# Altium footprint library OT Library.PcbLib: 396 footprints (part 22 of 25)
Each footprint in its own frame and in the unit in brackets; x right, y up, seen from the top. Pads: shape width x height; smd on the part's side, far side on the other; paste and mask are expansions set on the pad; w line width, h text height; cw(c..) or ccw(c..) is an arc to the next point about the centre after c.
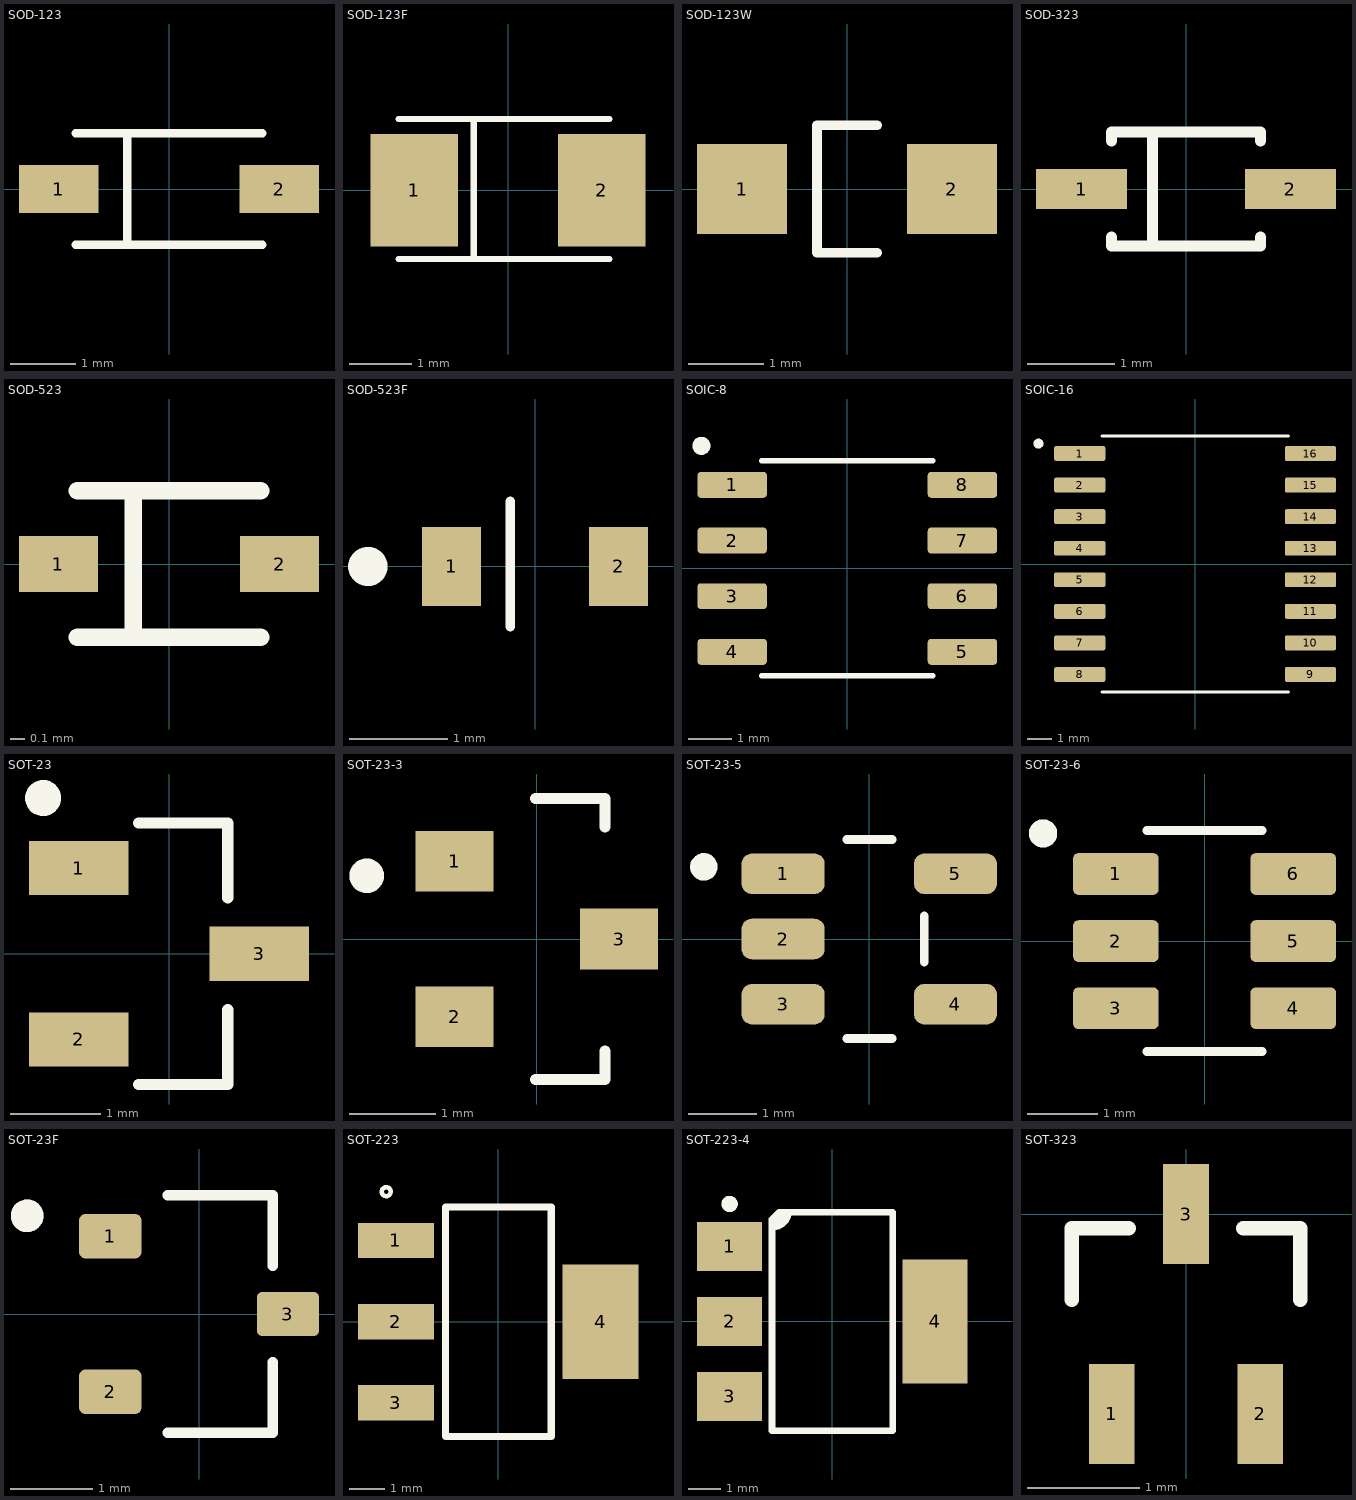
[diagram p21: the footprints below, top view; thin cyan lines are the x and y axes]

## SOD-123 [mm]
pads (2):
  rect 1.21x0.73 smd: 1(-1.68,0) 2(1.68,0)
Top Overlay:
  lines w0.127: -1.425,-0.85 1.425,-0.85 ; -1.425,0.85 1.425,0.85 ; -0.635,-0.85 -0.635,0.838
3D body: height 1.5, standoff -0.03, extent -1.825,-0.775 1.825,0.775

## SOD-123F [mm]
pads (2):
  rect 1.4x1.8 smd: 1(-1.5,0) 2(1.5,0)
Top Overlay:
  lines w0.1: -1.75,-1.1 1.62,-1.1 ; -1.75,1.14 1.62,1.14 ; -0.55,-1.1 -0.55,1.14
3D body: height 1.02, standoff 0, extent -1.9,-0.9 1.9,0.9

## SOD-123W [mm]
pads (2):
  rect 1.2x1.2 smd paste-0.05: 1(-1.4,0) 2(1.4,0)
Top Overlay:
  lines w0.127: 0.4,-0.85 -0.4,-0.85 -0.4,0.85 0.4,0.85
3D body: height 1.1, standoff 0, extent -1.75,-0.85 1.75,0.85

## SOD-323 [mm] "SC-76, SOD-323"
height 1.2
pads (2):
  rect 1.04x0.46 smd: 1(-1.19,0) 2(1.19,0)
Top Overlay:
  lines w0.127: -0.85,-0.55 -0.85,-0.65 0.85,-0.65 0.85,-0.55 ; -0.85,0.55 -0.85,0.65 0.85,0.65 0.85,0.55 ; -0.381,-0.635 -0.381,0.635
3D body: height 1.2, standoff 0, extent -1.25,-0.65 1.25,0.65

## SOD-523 [mm] "SC-79, SOD-523"
pads (2):
  rect 0.56x0.4 smd: 1(-0.785,0) 2(0.785,0)
Top Overlay:
  lines w0.127: -0.65,-0.52 0.65,-0.52 ; -0.65,0.52 0.65,0.52 ; -0.254,-0.52 -0.254,0.52
3D body: height 0.65, standoff 0, extent -0.8,-0.4 0.8,0.4

## SOD-523F [mm]
pads (2):
  rect 0.6x0.8 smd: 1(-0.85,0) 2(0.85,0)
Top Overlay:
  circle w0.2: c-1.703,0 r0.1
  lines w0.1: -0.254,-0.61 -0.254,0.66
3D body: height 0.7, standoff 0, extent -0.8,-0.4 0.8,0.4

## SOIC-8 [mm] "0.154\", 3.90mm Width"
pads (8):
  rrect25% 1.58x0.59 smd: 1(-2.625,1.905) 2(-2.625,0.635) 3(-2.625,-0.635) 4(-2.625,-1.905) 5(2.625,-1.905) 6(2.625,-0.635) 7(2.625,0.635) 8(2.625,1.905)
Top Overlay:
  circle w0.21: c-3.327,2.794 r0.1
  lines w0.127: -1.95,-2.45 1.95,-2.45 ; -1.95,2.45 1.95,2.45
3D body: height 1.75, standoff 0, extent -3,-2.5 3,2.5

## SOIC-16 [mm] "(0.295\", 7.50mm Width)"
pads (16):
  rrect25% 2.06x0.6 smd: 1(-4.64,4.445) 2(-4.64,3.175) 3(-4.64,1.905) 4(-4.64,0.635) 5(-4.64,-0.635) 6(-4.64,-1.905) 7(-4.64,-3.175) 8(-4.64,-4.445) 9(4.64,-4.445) 10(4.64,-3.175) 11(4.64,-1.905) 12(4.64,-0.635) 13(4.64,0.635) 14(4.64,1.905) 15(4.64,3.175) 16(4.64,4.445)
Top Overlay:
  circle w0.2: c-6.3,4.845 r0.1
  lines w0.127: -3.75,-5.15 3.75,-5.15 ; -3.75,5.15 3.75,5.15
3D body: height 2.65, standoff 0, extent -5.15,-5.15 5.15,5.15

## SOT-23 [mm] "TO-236AB"
height 1.1
pads (3):
  rect 1.1x0.6 smd paste-0.05: 1(-1,0.95) 2(-1,-0.95) 3(1,0)
Top Overlay:
  circle w0.2: c-1.397,1.727 r0.1
  lines w0.127: -0.336,-1.45 0.65,-1.45 0.65,-0.62 ; -0.336,1.45 0.65,1.45 0.65,0.62
3D body: height 1.1, standoff 0, extent -1.15,-1.45 1.15,1.45

## SOT-23-3 [mm] "TO-236-3, SC-59, SOT-23-3"
height 1.1
pads (3):
  rect 0.9x0.7 smd: 1(-0.95,0.9) 2(-0.95,-0.9) 3(0.95,0)
Top Overlay:
  circle w0.2: c-1.966,0.73 r0.1
  lines w0.127: -0.018,-1.625 0.787,-1.625 0.787,-1.295 ; -0.018,1.625 0.787,1.625 0.787,1.295
3D body: height 1.12, standoff 0, extent -1.321,-1.524 1.321,1.524

## SOT-23-5 [mm] "SC-74A, SOT-753"
pads (5):
  rrect50% 1.21x0.59 smd: 1(-1.255,0.95) 2(-1.255,0) 3(-1.255,-0.95) 4(1.255,-0.95) 5(1.255,0.95)
Top Overlay:
  circle w0.2: c-2.41,1.05 r0.1
  lines w0.127: -0.33,-1.45 0.33,-1.45 ; -0.33,1.45 0.33,1.45 ; 0.8,-0.335 0.8,0.335
3D body: height 1.45, standoff 0, extent -1.4,-1.45 1.4,1.45

## SOT-23-6 [mm]
pads (6):
  rrect25% 1.21x0.59 smd: 1(-1.255,0.95) 2(-1.255,0) 3(-1.255,-0.95) 4(1.255,-0.95) 5(1.255,0) 6(1.255,0.95)
Top Overlay:
  circle w0.2: c-2.286,1.524 r0.1
  lines w0.127: -0.813,-1.565 0.813,-1.565 ; -0.813,1.565 0.813,1.565
3D body: height 1.4, standoff -0.05, extent -1.4,-1.462 1.4,1.463

## SOT-23F [mm] "SOT-23-3 Flat Leads"
pads (3):
  rrect25% 0.76x0.54 smd: 1(-1.085,0.95) 2(-1.085,-0.95) 3(1.085,0)
Top Overlay:
  circle w0.2: c-2.1,1.2 r0.1
  lines w0.127: -0.385,-1.45 0.9,-1.45 0.9,-0.59 ; -0.385,1.45 0.9,1.45 0.9,0.59
3D Top:
  circle w0.2: c-2.1,1.2 r0.1
3D body: height 0.88, standoff 0, extent -1.2,-1.4 1.2,1.4

## SOT-223 [mm] "TO-261-4, TO-261AA"
pads (4):
  rect 2.15x1 smd: 1(-2.9,2.3) 2(-2.9,0) 3(-2.9,-2.3)
  rect 2.15x3.25 smd: 4(2.9,0)
Top Overlay:
  circle w0.127: c-3.175,3.683 r0.127
  lines w0.203: -1.5,-3.25 -1.5,3.25 1.5,3.25 1.5,-3.25 -1.5,-3.25
3D body: height 1.8, standoff 0, extent -3.499,-3.25 3.499,3.25

## SOT-223-4 [mm] "SOT223, 4-Leads, Body 6.50x7.00mm (avg), Pitch 2.30mm"
height 1.8
pads (4):
  rect 2x1.5 smd: 1(-3.15,2.3) 2(-3.15,0) 3(-3.15,-2.3)
  rect 2x3.8 smd: 4(3.15,0)
Top Overlay:
  circle w0.25: c-3.15,3.6 r0.125
  region: -1.65,3.275 -1.35,3.35 -1.35,3.2 -1.65,2.9 -1.85,2.9
  lines w0.2: -1.85,2.9 -1.8,2.9 ccw(c-1.8,3.35) -1.35,3.35 ; -1.85,-3.35 -1.85,3.125 -1.625,3.35 1.85,3.35 1.85,-3.35 -1.85,-3.35
3D body: height 1.8, standoff 0, extent -3.516,-3.25 3.5,3.25

## SOT-323 [mil] "SC-70, SOT-323"
pads (3):
  rect 16x35 smd: 1(-26,-70) 2(26,-70) 3(0,0)
Top Overlay:
  lines w5: -40,-30 -40,-5 -20,-5 ; 20,-5 40,-5 40,-30
3D body: height 41.34, standoff -1.97, extent -39.37,-72.67 39.37,10